# Altium footprint library IntegratedPcbLib.PcbLib: 81 footprints (part 2 of 6)
Each footprint in its own frame and in the unit in brackets; x right, y up, seen from the top. Pads: shape width x height; smd on the part's side, far side on the other; paste and mask are expansions set on the pad; w line width, h text height; cw(c..) or ccw(c..) is an arc to the next point about the centre after c.
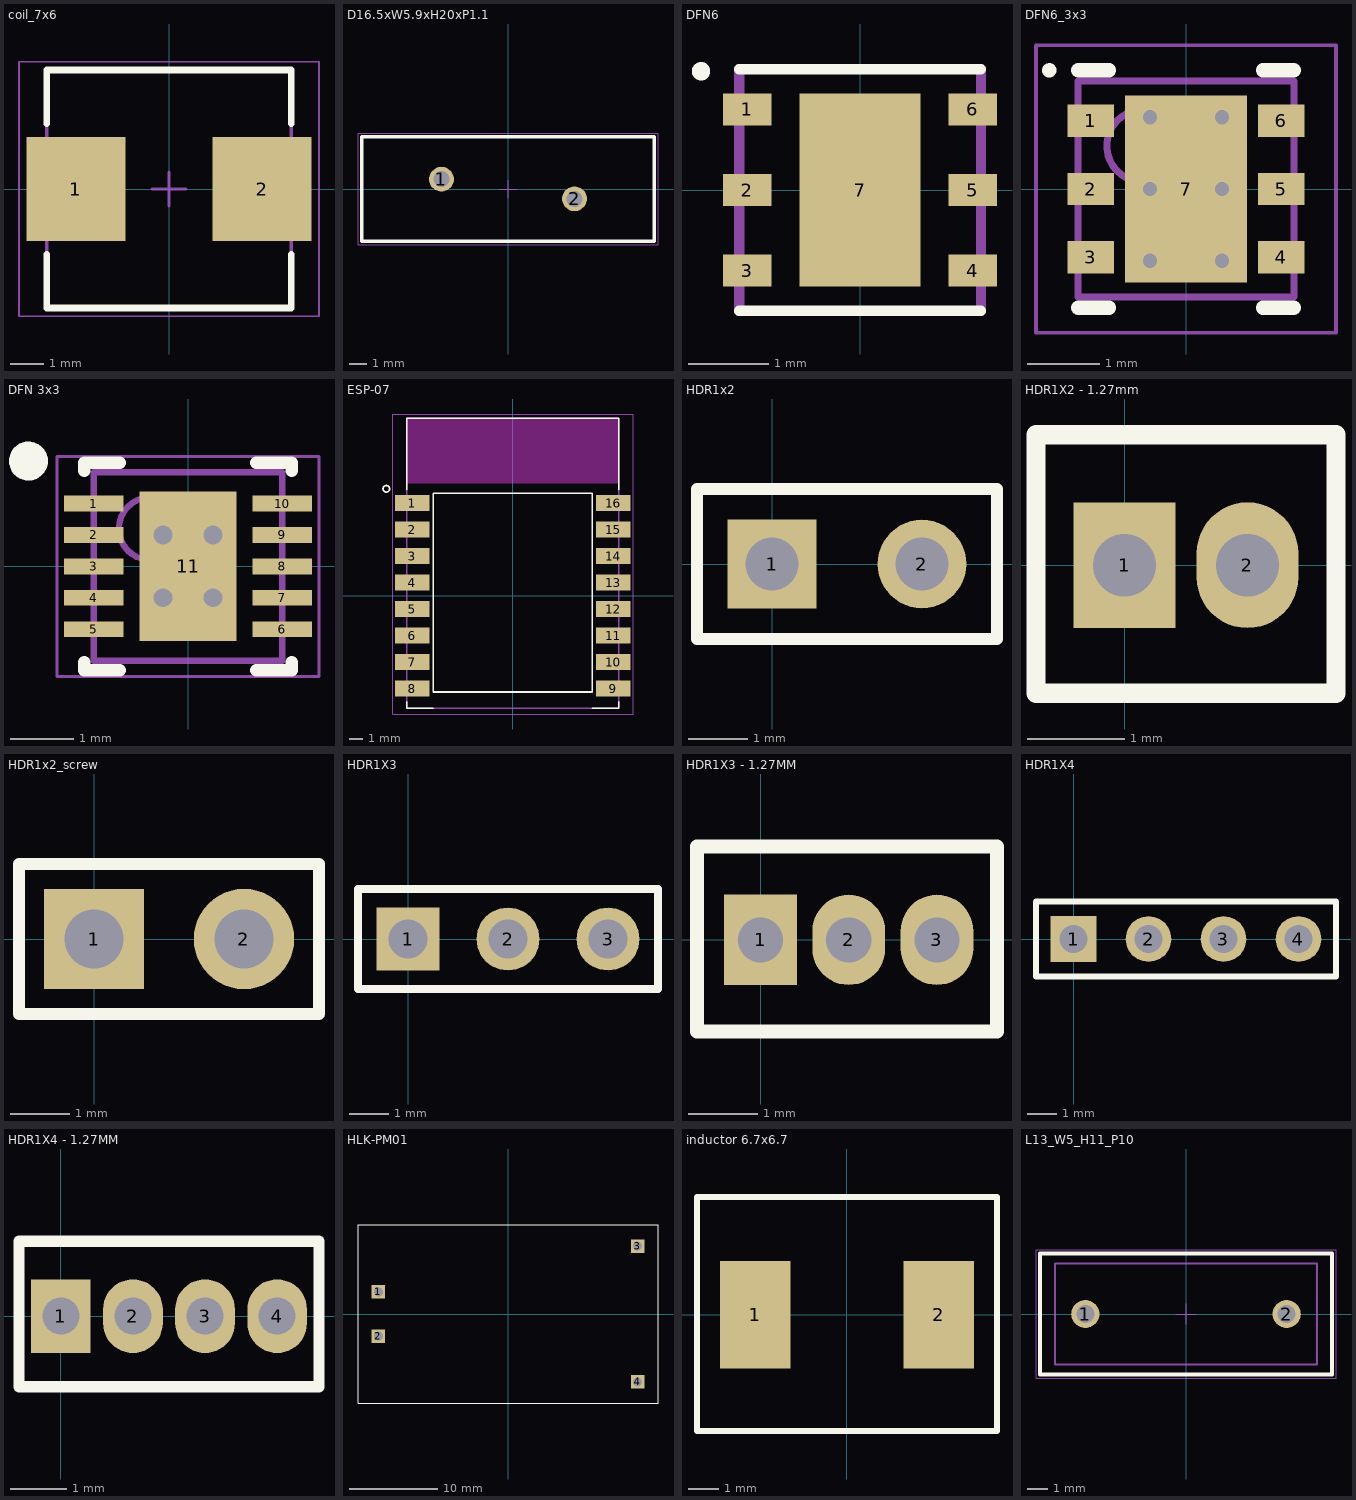
[diagram p1: the footprints below, top view; thin cyan lines are the x and y axes]

## coil_7x6 [mm] "Precision Wire Wound Inductor, 2-Leads, Body 7,15x6,75mm, IPC Medium Density"
height 3
pads (2):
  rect 2.95x3.1 smd: 1(-2.775,0) 2(2.775,0)
Top Overlay:
  lines w0.2: -3.65,-1.95 -3.65,-3.55 3.65,-3.55 3.65,-1.95 ; -3.65,1.95 -3.65,3.55 3.65,3.55 3.65,1.95
Mechanical 13:
  lines w0.1: -3.65,-3.55 -3.65,3.55 3.65,3.55 3.65,-3.55 -3.65,-3.55
Mechanical 15:
  lines w0.05: -4.475,-3.8 -4.475,3.8 4.475,3.8 4.475,-3.8 -4.475,-3.8
  lines w0.1: -0.5,0 0.5,0 ; 0,-0.5 0,0.5
3D body "INDP7268X30N.step": height 3.1, standoff 0, extent -3.675,-3.375 3.675,3.375

## D16.5xW5.9xH20xP1.1 [mm] "Disk Varistor, Diameter 16.5mm, Width 5.9mm"
height 20
pads (2):
  round 1.4 hole 0.9: 1(-3.75,0.55) 2(3.75,-0.55)
Top Overlay:
  lines w0.2: -8.25,-2.95 -8.25,2.95 8.25,2.95 8.25,-2.95 -8.25,-2.95
Mechanical 13:
  lines w0.1: -8.25,-2.95 8.25,-2.95 8.25,2.95 -8.25,2.95 -8.25,-2.95
Mechanical 15:
  lines w0.05: -0.5,0 0.5,0 ; 0,-0.5 0,0.5 ; -8.45,-3.15 -8.45,3.15 8.45,3.15 8.45,-3.15 -8.45,-3.15
3D body "820x42511x.stp": height 17.5, standoff -22.51, extent -7.5,-2.15 7.5,2.15

## DFN6 [mm]
pads (7):
  rect 0.6x0.4 smd: 1(-1.4,1) 2(-1.4,0) 3(-1.4,-1) 4(1.4,-1) 5(1.4,0) 6(1.4,1)
  rect 1.5x2.4 smd: 7(0,0)
Top Overlay:
  circle w0.127: c-1.975,1.475 r0.05
  lines w0.127: -1.5,-1.5 1.5,-1.5 ; -1.5,1.5 1.5,1.5
Top Paste:
  region: -0.701,1.15 0.7,1.15 0.7,-1.152 -0.701,-1.152
Mechanical 4:
  lines w0.127: -1.5,-1.5 -1.5,1.5 -1.5,-1.5 ; 1.5,-1.5 1.5,1.5 1.5,-1.5
3D body "User Library-SHT20-1.SLDPRT": height 1.1, standoff -0.01, extent -1.51,-1.5 1.51,1.5

## DFN6_3x3 [mm]
height 1
pads (7):
  rect 0.65x0.45 smd: 1(-1.325,0.95) 2(-1.325,0) 3(-1.325,-0.95) 4(1.325,-0.95) 5(1.325,0) 6(1.325,0.95)
  rect 1.7x2.6 smd: 7(0,0)
via 0.5,-1 diameter 0.5 hole 0.2
via -0.5,-1 diameter 0.5 hole 0.2
via 0.5,0 diameter 0.5 hole 0.2
via -0.5,0 diameter 0.5 hole 0.2
via 0.5,1 diameter 0.5 hole 0.2
via -0.5,1 diameter 0.5 hole 0.2
Top Overlay:
  circle w0.1: c-1.9,1.65 r0.05
  lines w0.2: -1.5,-1.65 -1.07,-1.65 ; -1.5,1.65 -1.07,1.65 ; 1.07,-1.65 1.5,-1.65 ; 1.07,1.65 1.5,1.65
Mechanical 13:
  circle w0.1: c-0.6,0.6 r0.5
  lines w0.1: -1.5,-1.5 1.5,-1.5 1.5,1.5 -1.5,1.5 -1.5,-1.5
Mechanical 15:
  lines w0.05: -2.085,-2 2.085,-2 2.085,2 -2.085,2 -2.085,-2
  lines w0.1: -0.5,0 0.5,0 ; 0,-0.5 0,0.5
3D body "User Library-dfn6_3x3_rm0_95.step": height 0.8, standoff 0, extent -1.55,-1.5 1.55,1.5

## DFN 3x3 [mm] "SON, 10-Leads, Body 3,00x3,00mm, Pitch 0,50mm, Thermal Pad 2,38x1,55mm, IPC Medium Density"
height 1
pads (11):
  rect 0.95x0.25 smd: 1(-1.5,1) 2(-1.5,0.5) 3(-1.5,0) 4(-1.5,-0.5) 5(-1.5,-1) 6(1.5,-1) 7(1.5,-0.5) 8(1.5,0) 9(1.5,0.5) 10(1.5,1)
  rect 1.55x2.38 smd: 11(0,0)
via -0.4,0.5 diameter 0.55 hole 0.3
via 0.4,0.5 diameter 0.55 hole 0.3
via -0.4,-0.5 diameter 0.55 hole 0.3
via 0.4,-0.5 diameter 0.55 hole 0.3
Top Overlay:
  circle w0.32: c-2.54,1.676 r0.15
  lines w0.2: -1.65,-1.525 -1.65,-1.65 -1.09,-1.65 ; -1.65,1.525 -1.65,1.65 -1.09,1.65 ; 1.09,-1.65 1.65,-1.65 1.65,-1.525 ; 1.09,1.65 1.65,1.65 1.65,1.525
Mechanical 13:
  circle w0.1: c-0.6,0.6 r0.5
  lines w0.1: -1.5,-1.5 -1.5,1.5 1.5,1.5 1.5,-1.5 -1.5,-1.5
Mechanical 15:
  lines w0.05: -2.085,-1.75 -2.085,1.75 2.085,1.75 2.085,-1.75 -2.085,-1.75
  lines w0.1: -0.5,0 0.5,0 ; 0,-0.5 0,0.5
3D body "SON65P300X100_HS-11N.step": height 1, standoff 0, extent -1.575,-1.575 1.575,1.575

## ESP-07 [mm]
pads (16):
  rect 2.6x1.2 smd: 1(-7.6,7) 2(-7.6,5) 3(-7.6,3) 4(-7.6,1) 5(-7.6,-1) 6(-7.6,-3) 7(-7.6,-5) 8(-7.6,-7) 9(7.6,-7) 10(7.6,-5) 11(7.6,-3) 12(7.6,-1) 13(7.6,1) 14(7.6,3) 15(7.6,5) 16(7.6,7)
Top Overlay:
  circle w0.127: c-9.55,8.075 r0.25
  lines w0.127: -8,-8 -8,-8.5 -6,-8.5 ; -8,8 -8,13.4 8,13.4 8,8 ; 6,-8.5 8,-8.5 8,-8 ; -6,-7.26 -6,7.74 6,7.74 6,-7.26 -6,-7.26
Keep-Out Layer:
  region: -8.009,13.35 8,13.35 8,8.51 -8.009,8.51
Mechanical 4:
  lines w0.127: -8,-8.5 -8,13.4 ; -8,-8.5 8,-8.5 ; -8,-8.5 -8,13.4 ; -8,-8.5 8,-8.5 ; -8,13.4 8,13.4 ; -8,13.4 8,13.4 ; 8,-8.5 8,13.4 ; 8,-8.5 8,13.4
Mechanical 16:
  lines w0.05: -9.075,-8.925 -9.075,13.725 9.075,13.725 9.075,-8.925 -9.075,-8.925
3D body: height 0, standoff 0, extent -8.001,-8.501 -5.999,-7.999
3D body: height 0, standoff 0, extent 5.999,-8.501 8.001,-7.999
3D body: height 0, standoff 0, extent -8,8 8.001,13.3
3D body "User Library-ESP07-1.step": height 3.5, standoff -0.01, extent -8.006,-8.662 7.994,13.338

## HDR1x2 [mm] "Connector; Header; 2 Position"
pads (2):
  rect 1.5x1.5 hole 0.9: 1(0,0)
  round 1.5 hole 0.9: 2(2.54,0)
Top Overlay:
  lines w0.2: -1.27,-1.27 -1.27,1.27 3.81,1.27 3.81,-1.27 -1.27,-1.27
3D body "User Library-Header Vertical 2_54mm Pitch2-12 Way.STEP": height 6.04, standoff -2.84, extent -1.275,-1.27 3.805,1.27

## HDR1X2 - 1.27mm [mm] "Connector; Header; 2 Position"
pads (2):
  rect 1.05x1.3 hole 0.65: 1(0,0)
  oval 1.05x1.3 hole 0.65: 2(1.27,0)
Top Overlay:
  lines w0.2: -0.914,-1.321 2.184,-1.321 2.184,1.346 -0.914,1.346 -0.914,-1.321
3D body "User Library-PIN-Header-1_27_1x2.step": height 4.85, standoff -2.4, extent -0.635,-1.168 1.905,1.232

## HDR1x2_screw [mm] "Connector; Header; 2 Position"
pads (2):
  rect 1.7x1.7 hole 1: 1(0,0)
  round 1.7 hole 1: 2(2.54,0)
Top Overlay:
  lines w0.2: -1.27,-1.27 -1.27,1.27 3.81,1.27 3.81,-1.27 -1.27,-1.27
3D body "User Library-bornier 2 voies.step": height 8.5, standoff -3.5, extent -1.49,-3.125 4.05,3.075

## HDR1X3 [mm] "Connector; Header; 3 Position"
pads (3):
  rect 1.6x1.6 hole 1: 1(0,0)
  round 1.6 hole 1: 2(2.54,0) 3(5.08,0)
Top Overlay:
  lines w0.2: -1.27,-1.27 6.35,-1.27 6.35,1.27 -1.27,1.27 -1.27,-1.27
3D body "User Library-Header_Male_3Pin.STEP": height 8.54, standoff -3, extent -1.275,-1.25 6.345,1.24

## HDR1X3 - 1.27MM [mm] "Connector; Header; 4 Position"
pads (3):
  rect 1.05x1.3 hole 0.65: 1(0,0)
  oval 1.05x1.3 hole 0.65: 2(1.27,0) 3(2.54,0)
Top Overlay:
  lines w0.2: -0.914,-1.321 3.404,-1.321 3.404,1.346 -0.914,1.346 -0.914,-1.321
3D body "User Library-PIN-Header-1_27_1x3.step": height 4.85, standoff -2.4, extent -0.635,-1.2 3.175,1.2

## HDR1X4 [mm] "Connector; Header; 4 Position"
pads (4):
  rect 1.55x1.55 hole 0.95: 1(0,0)
  round 1.55 hole 0.95: 2(2.54,0) 3(5.08,0) 4(7.62,0)
Top Overlay:
  lines w0.2: -1.27,-1.27 -1.27,1.27 8.89,1.27 8.89,-1.27 -1.27,-1.27
3D body "User Library-Header_Male_4Pin.STEP": height 8.54, standoff -3, extent -1.27,-1.245 8.89,1.245

## HDR1X4 - 1.27MM [mm] "Connector; Header; 4 Position"
pads (4):
  rect 1.05x1.3 hole 0.65: 1(0,0)
  oval 1.05x1.3 hole 0.65: 2(1.27,0) 3(2.54,0) 4(3.81,0)
Top Overlay:
  lines w0.2: -0.737,-1.245 -0.737,1.321 4.547,1.321 4.547,-1.245 -0.737,-1.245
3D body "User Library-PIN-Header-1_27_1x2.step": height 4.85, standoff -2.4, extent 1.905,-1.168 4.445,1.232
3D body "User Library-PIN-Header-1_27_1x2.step": height 4.85, standoff -2.4, extent -0.635,-1.168 1.905,1.232

## HLK-PM01 [mil]
pads (4):
  rect 60x60 hole 40: 1(-578.74,98.43) 2(-578.74,-98.43) 3(578.74,303.15) 4(578.74,-303.15)
Top Overlay:
  lines w5: -669.29,-397.64 669.29,-397.64 669.29,397.64 -669.29,397.64 -669.29,-397.64
3D body "User Library-hilink.step": height 590.94, standoff -196.85, extent -669.29,-397.64 669.29,397.64

## inductor 6.7x6.7 [mm]
pads (2):
  rect 2.3x3.5 smd: 1(-3,0) 2(3,0)
Top Overlay:
  lines w0.2: -4.9,-3.8 -4.9,0 -4.9,3.85 4.9,3.85 4.9,-3.8 -4.9,-3.8
3D body "User Library-DE0703.step": height 3.2, standoff 0, extent -3.65,-3.65 3.65,3.65

## L13_W5_H11_P10 [mm] "THT Film Capacitors, body 13x5mm"
height 12
pads (2):
  round 1.4 hole 0.9: 1(-5,0) 2(5,0)
Top Overlay:
  lines w0.2: -7.25,-3 -7.25,3 7.25,3 7.25,-3 -7.25,-3
Mechanical 13:
  lines w0.1: -6.5,-2.5 6.5,-2.5 6.5,2.5 -6.5,2.5 -6.5,-2.5
Mechanical 15:
  lines w0.05: -0.5,0 0.5,0 ; 0,-0.5 0,0.5 ; -7.45,-3.2 -7.45,3.2 7.45,3.2 7.45,-3.2 -7.45,-3.2
3D body "10x13x5x11.stp": height 11.05, standoff -3.95, extent -6.5,-2.5 6.5,2.5